# Altium footprint library Connector_Samtec_HLE_THT.PcbLib: 141 footprints (part 9 of 9)
Each footprint in its own frame and in the unit in brackets; x right, y up, seen from the top. Pads: shape width x height; smd on the part's side, far side on the other; paste and mask are expansions set on the pad; w line width, h text height; cw(c..) or ccw(c..) is an arc to the next point about the centre after c.
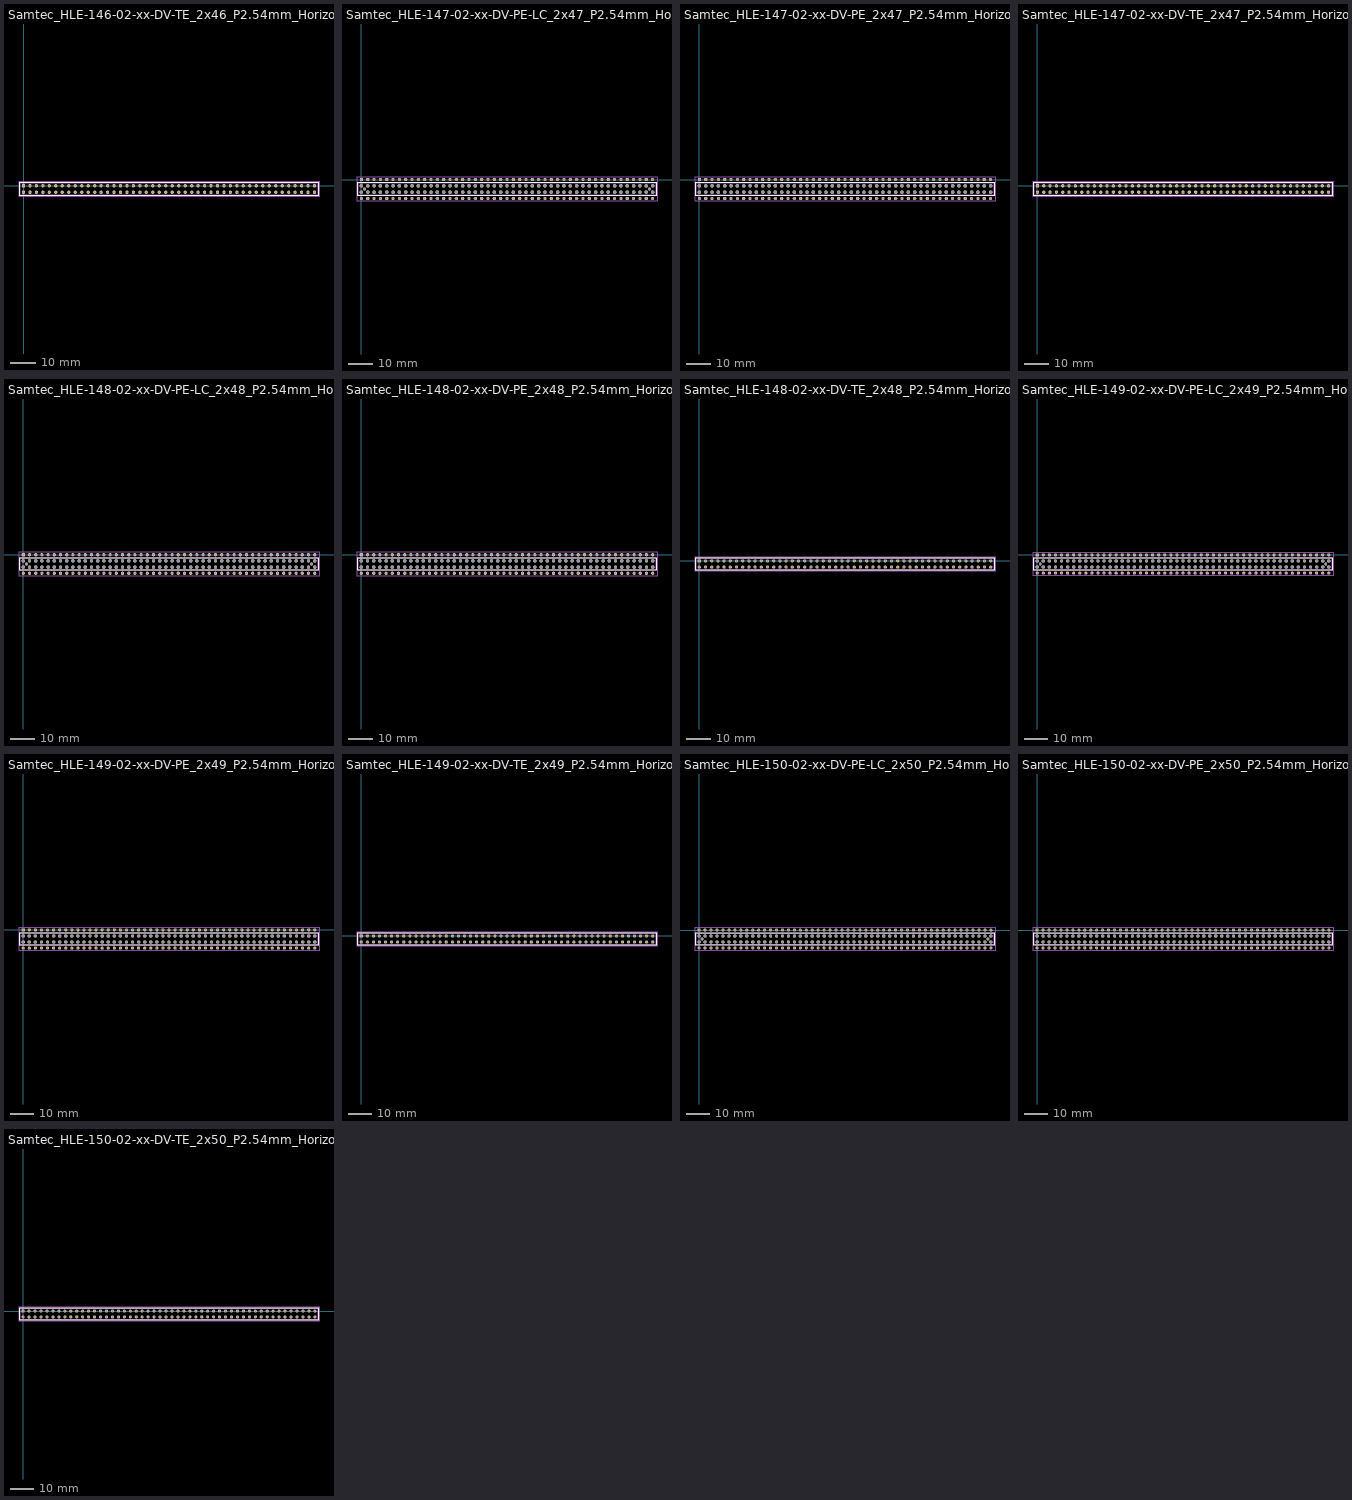
[diagram p8: the footprints below, top view; thin cyan lines are the x and y axes]

## Samtec_HLE-146-02-xx-DV-TE_2x46_P2.54mm_Horizontal [mm]
pads (92):
  rrect19% 1.31x1.31 hole 0.71: 1(0,0)
  round 1.31 hole 0.71: 2(0,-2.54) 3(2.54,0) 4(2.54,-2.54) 5(5.08,0) 6(5.08,-2.54) 7(7.62,0) 8(7.62,-2.54) 9(10.16,0) 10(10.16,-2.54) 11(12.7,0) 12(12.7,-2.54) 13(15.24,0) 14(15.24,-2.54) 15(17.78,0) 16(17.78,-2.54) 17(20.32,0) 18(20.32,-2.54) 19(22.86,0) 20(22.86,-2.54) 21(25.4,0) 22(25.4,-2.54) 23(27.94,0) 24(27.94,-2.54) 25(30.48,0) 26(30.48,-2.54) 27(33.02,0) 28(33.02,-2.54) 29(35.56,0) 30(35.56,-2.54) 31(38.1,0) 32(38.1,-2.54) 33(40.64,0) 34(40.64,-2.54) 35(43.18,0) 36(43.18,-2.54) 37(45.72,0) 38(45.72,-2.54) 39(48.26,0) 40(48.26,-2.54) 41(50.8,0) 42(50.8,-2.54) 43(53.34,0) 44(53.34,-2.54) 45(55.88,0) 46(55.88,-2.54) 47(58.42,0) 48(58.42,-2.54) 49(60.96,0) 50(60.96,-2.54) 51(63.5,0) 52(63.5,-2.54) 53(66.04,0) 54(66.04,-2.54) 55(68.58,0) 56(68.58,-2.54) 57(71.12,0) 58(71.12,-2.54) 59(73.66,0) 60(73.66,-2.54) 61(76.2,0) 62(76.2,-2.54) 63(78.74,0) 64(78.74,-2.54) 65(81.28,0) 66(81.28,-2.54) 67(83.82,0) 68(83.82,-2.54) 69(86.36,0) 70(86.36,-2.54) 71(88.9,0) 72(88.9,-2.54) 73(91.44,0) 74(91.44,-2.54) 75(93.98,0) 76(93.98,-2.54) 77(96.52,0) 78(96.52,-2.54) 79(99.06,0) 80(99.06,-2.54) 81(101.6,0) 82(101.6,-2.54) 83(104.14,0) 84(104.14,-2.54) 85(106.68,0) 86(106.68,-2.54) 87(109.22,0) 88(109.22,-2.54) 89(111.76,0) 90(111.76,-2.54) 91(114.3,0) 92(114.3,-2.54)
F.SilkS:
  lines w0.12: -1.38,-3.92 115.68,-3.92 115.68,1.38 -1.38,1.38 -1.38,-3.92
F.CrtYd:
  lines w0.05: -1.77,-4.31 116.07,-4.31 116.07,1.77 -1.77,1.77 -1.77,-4.31
F.Fab:
  lines w0.1: -0.5,1.27 0,0.563 0.5,1.27 ; -1.27,-3.81 -1.27,1.27 115.57,1.27 115.57,-3.81 -1.27,-3.81
  text "'.Designator'" at 53.103,-3.95 h1

## Samtec_HLE-147-02-xx-DV-PE-LC_2x47_P2.54mm_Horizontal [mm]
pads (190):
  rrect19% 1.31x1.31 hole 0.71: 1(0,0)
  round 1.31 hole 0.71: 2(0,-7.62) 3(2.54,0) 4(2.54,-7.62) 5(5.08,0) 6(5.08,-7.62) 7(7.62,0) 8(7.62,-7.62) 9(10.16,0) 10(10.16,-7.62) 11(12.7,0) 12(12.7,-7.62) 13(15.24,0) 14(15.24,-7.62) 15(17.78,0) 16(17.78,-7.62) 17(20.32,0) 18(20.32,-7.62) 19(22.86,0) 20(22.86,-7.62) 21(25.4,0) 22(25.4,-7.62) 23(27.94,0) 24(27.94,-7.62) 25(30.48,0) 26(30.48,-7.62) 27(33.02,0) 28(33.02,-7.62) 29(35.56,0) 30(35.56,-7.62) 31(38.1,0) 32(38.1,-7.62) 33(40.64,0) 34(40.64,-7.62) 35(43.18,0) 36(43.18,-7.62) 37(45.72,0) 38(45.72,-7.62) 39(48.26,0) 40(48.26,-7.62) 41(50.8,0) 42(50.8,-7.62) 43(53.34,0) 44(53.34,-7.62) 45(55.88,0) 46(55.88,-7.62) 47(58.42,0) 48(58.42,-7.62) 49(60.96,0) 50(60.96,-7.62) 51(63.5,0) 52(63.5,-7.62) 53(66.04,0) 54(66.04,-7.62) 55(68.58,0) 56(68.58,-7.62) 57(71.12,0) 58(71.12,-7.62) 59(73.66,0) 60(73.66,-7.62) 61(76.2,0) 62(76.2,-7.62) 63(78.74,0) 64(78.74,-7.62) 65(81.28,0) 66(81.28,-7.62) 67(83.82,0) 68(83.82,-7.62) 69(86.36,0) 70(86.36,-7.62) 71(88.9,0) 72(88.9,-7.62) 73(91.44,0) 74(91.44,-7.62) 75(93.98,0) 76(93.98,-7.62) 77(96.52,0) 78(96.52,-7.62) 79(99.06,0) 80(99.06,-7.62) 81(101.6,0) 82(101.6,-7.62) 83(104.14,0) 84(104.14,-7.62) 85(106.68,0) 86(106.68,-7.62) 87(109.22,0) 88(109.22,-7.62) 89(111.76,0) 90(111.76,-7.62) 91(114.3,0) 92(114.3,-7.62) 93(116.84,0) 94(116.84,-7.62)
  round 1.4 hole 1.4: Un1(12.7,-2.54) Un2(83.82,-2.54) Un3(71.12,-5.08) Un4(111.76,-2.54) Un5(27.94,-2.54) Un6(20.32,-5.08) Un7(96.52,-2.54) Un8(33.02,-2.54) Un9(10.16,-5.08) Un10(25.4,-2.54) Un11(60.96,-5.08) Un12(55.88,-5.08) Un13(66.04,-2.54) Un14(10.16,-2.54) Un15(73.66,-5.08) Un16(20.32,-2.54) Un17(86.36,-5.08) Un18(68.58,-2.54) Un19(50.8,-5.08) Un20(63.5,-5.08) Un21(76.2,-5.08) Un22(116.84,-5.08) Un23(109.22,-5.08) Un24(17.78,-5.08) Un25(114.3,-2.54) Un26(109.22,-2.54) Un27(58.42,-2.54) Un28(5.08,-5.08) Un29(73.66,-2.54) Un30(99.06,-2.54) Un31(15.24,-2.54) Un32(33.02,-5.08) Un33(93.98,-5.08) Un34(104.14,-2.54) Un35(12.7,-5.08) Un36(93.98,-2.54) Un37(35.56,-5.08) Un38(114.3,-5.08) Un39(17.78,-2.54) Un40(101.6,-5.08) Un41(0,-2.54) Un42(22.86,-5.08) Un43(91.44,-5.08) Un44(30.48,-2.54) Un45(60.96,-2.54) Un46(106.68,-5.08) Un47(38.1,-5.08) Un48(91.44,-2.54) Un49(38.1,-2.54) Un50(81.28,-2.54) Un51(104.14,-5.08) Un52(71.12,-2.54) Un53(53.34,-5.08) Un54(78.74,-2.54) Un55(55.88,-2.54) Un56(27.94,-5.08) Un57(83.82,-5.08) Un58(101.6,-2.54) Un59(53.34,-2.54) Un60(40.64,-5.08) Un61(111.76,-5.08) Un63(116.84,-2.54) Un64(43.18,-2.54) Un65(78.74,-5.08) Un66(99.06,-5.08) Un67(7.62,-5.08) Un68(30.48,-5.08) Un69(25.4,-5.08) Un70(5.08,-2.54) Un71(48.26,-5.08) Un72(63.5,-2.54) Un73(58.42,-5.08) Un74(35.56,-2.54) Un75(0,-5.08) Un76(2.54,-5.08) Un77(88.9,-5.08) Un78(22.86,-2.54) Un79(88.9,-2.54) Un80(50.8,-2.54) Un81(86.36,-2.54) Un82(48.26,-2.54) Un83(66.04,-5.08) Un84(68.58,-5.08) Un85(45.72,-5.08) Un86(76.2,-2.54) Un87(15.24,-5.08) Un88(96.52,-5.08) Un89(7.62,-2.54) Un90(106.68,-2.54) Un92(43.18,-5.08) Un93(45.72,-2.54) Un94(2.54,-2.54) Un95(81.28,-5.08) Un96(40.64,-2.54)
  round 1.19 hole 1.19: Un62(115.57,-3.81) Un91(1.27,-3.81)
F.SilkS:
  lines w0.12: -1.38,-6.46 118.22,-6.46 118.22,-1.16 -1.38,-1.16 -1.38,-6.46
F.CrtYd:
  lines w0.05: -1.77,-8.78 118.61,-8.78 118.61,1.16 -1.77,1.16 -1.77,-8.78
F.Fab:
  lines w0.1: -0.5,-1.27 0,-1.977 0.5,-1.27 ; -1.27,-6.35 -1.27,-1.27 118.11,-1.27 118.11,-6.35 -1.27,-6.35
  text "'.Designator'" at 54.373,-6.49 h1

## Samtec_HLE-147-02-xx-DV-PE_2x47_P2.54mm_Horizontal [mm]
pads (188):
  rrect19% 1.31x1.31 hole 0.71: 1(0,0)
  round 1.31 hole 0.71: 2(0,-7.62) 3(2.54,0) 4(2.54,-7.62) 5(5.08,0) 6(5.08,-7.62) 7(7.62,0) 8(7.62,-7.62) 9(10.16,0) 10(10.16,-7.62) 11(12.7,0) 12(12.7,-7.62) 13(15.24,0) 14(15.24,-7.62) 15(17.78,0) 16(17.78,-7.62) 17(20.32,0) 18(20.32,-7.62) 19(22.86,0) 20(22.86,-7.62) 21(25.4,0) 22(25.4,-7.62) 23(27.94,0) 24(27.94,-7.62) 25(30.48,0) 26(30.48,-7.62) 27(33.02,0) 28(33.02,-7.62) 29(35.56,0) 30(35.56,-7.62) 31(38.1,0) 32(38.1,-7.62) 33(40.64,0) 34(40.64,-7.62) 35(43.18,0) 36(43.18,-7.62) 37(45.72,0) 38(45.72,-7.62) 39(48.26,0) 40(48.26,-7.62) 41(50.8,0) 42(50.8,-7.62) 43(53.34,0) 44(53.34,-7.62) 45(55.88,0) 46(55.88,-7.62) 47(58.42,0) 48(58.42,-7.62) 49(60.96,0) 50(60.96,-7.62) 51(63.5,0) 52(63.5,-7.62) 53(66.04,0) 54(66.04,-7.62) 55(68.58,0) 56(68.58,-7.62) 57(71.12,0) 58(71.12,-7.62) 59(73.66,0) 60(73.66,-7.62) 61(76.2,0) 62(76.2,-7.62) 63(78.74,0) 64(78.74,-7.62) 65(81.28,0) 66(81.28,-7.62) 67(83.82,0) 68(83.82,-7.62) 69(86.36,0) 70(86.36,-7.62) 71(88.9,0) 72(88.9,-7.62) 73(91.44,0) 74(91.44,-7.62) 75(93.98,0) 76(93.98,-7.62) 77(96.52,0) 78(96.52,-7.62) 79(99.06,0) 80(99.06,-7.62) 81(101.6,0) 82(101.6,-7.62) 83(104.14,0) 84(104.14,-7.62) 85(106.68,0) 86(106.68,-7.62) 87(109.22,0) 88(109.22,-7.62) 89(111.76,0) 90(111.76,-7.62) 91(114.3,0) 92(114.3,-7.62) 93(116.84,0) 94(116.84,-7.62)
  round 1.4 hole 1.4: Un1(91.44,-5.08) Un2(45.72,-2.54) Un3(43.18,-5.08) Un4(20.32,-5.08) Un5(43.18,-2.54) Un6(40.64,-2.54) Un7(96.52,-5.08) Un8(88.9,-2.54) Un9(66.04,-5.08) Un10(30.48,-2.54) Un11(48.26,-2.54) Un12(114.3,-5.08) Un13(81.28,-2.54) Un14(93.98,-2.54) Un15(15.24,-2.54) Un16(116.84,-5.08) Un17(30.48,-5.08) Un18(35.56,-2.54) Un19(73.66,-5.08) Un20(53.34,-5.08) Un21(106.68,-5.08) Un22(25.4,-2.54) Un23(5.08,-5.08) Un24(2.54,-2.54) Un25(106.68,-2.54) Un26(60.96,-5.08) Un27(27.94,-5.08) Un28(111.76,-5.08) Un29(0,-2.54) Un30(35.56,-5.08) Un31(0,-5.08) Un32(116.84,-2.54) Un33(99.06,-2.54) Un34(15.24,-5.08) Un35(101.6,-5.08) Un36(33.02,-2.54) Un37(109.22,-5.08) Un38(5.08,-2.54) Un39(109.22,-2.54) Un40(71.12,-5.08) Un41(86.36,-5.08) Un42(17.78,-2.54) Un43(101.6,-2.54) Un44(38.1,-5.08) Un45(10.16,-2.54) Un46(86.36,-2.54) Un47(111.76,-2.54) Un48(104.14,-2.54) Un49(50.8,-2.54) Un50(38.1,-2.54) Un51(83.82,-2.54) Un52(25.4,-5.08) Un53(78.74,-5.08) Un54(114.3,-2.54) Un55(55.88,-5.08) Un56(2.54,-5.08) Un57(76.2,-5.08) Un58(104.14,-5.08) Un59(83.82,-5.08) Un60(91.44,-2.54) Un61(68.58,-2.54) Un62(60.96,-2.54) Un63(12.7,-5.08) Un64(12.7,-2.54) Un65(58.42,-5.08) Un66(55.88,-2.54) Un67(50.8,-5.08) Un68(17.78,-5.08) Un69(76.2,-2.54) Un70(93.98,-5.08) Un71(22.86,-5.08) Un72(45.72,-5.08) Un73(22.86,-2.54) Un74(53.34,-2.54) Un75(63.5,-5.08) Un76(7.62,-5.08) Un77(78.74,-2.54) Un78(88.9,-5.08) Un79(58.42,-2.54) Un80(27.94,-2.54) Un81(10.16,-5.08) Un82(7.62,-2.54) Un83(63.5,-2.54) Un84(48.26,-5.08) Un85(81.28,-5.08) Un86(73.66,-2.54) Un87(68.58,-5.08) Un88(40.64,-5.08) Un89(20.32,-2.54) Un90(33.02,-5.08) Un91(96.52,-2.54) Un92(99.06,-5.08) Un93(66.04,-2.54) Un94(71.12,-2.54)
F.SilkS:
  lines w0.12: -1.38,-6.46 -1.38,-1.16 118.22,-1.16 118.22,-6.46 -1.38,-6.46
F.CrtYd:
  lines w0.05: -1.77,-8.78 -1.77,1.16 118.61,1.16 118.61,-8.78 -1.77,-8.78
F.Fab:
  lines w0.1: -0.5,-1.27 0,-1.977 0.5,-1.27 ; -1.27,-6.35 118.11,-6.35 118.11,-1.27 -1.27,-1.27 -1.27,-6.35
  text "'.Designator'" at 54.373,-6.49 h1

## Samtec_HLE-147-02-xx-DV-TE_2x47_P2.54mm_Horizontal [mm]
pads (94):
  rrect19% 1.31x1.31 hole 0.71: 1(0,0)
  round 1.31 hole 0.71: 2(0,-2.54) 3(2.54,0) 4(2.54,-2.54) 5(5.08,0) 6(5.08,-2.54) 7(7.62,0) 8(7.62,-2.54) 9(10.16,0) 10(10.16,-2.54) 11(12.7,0) 12(12.7,-2.54) 13(15.24,0) 14(15.24,-2.54) 15(17.78,0) 16(17.78,-2.54) 17(20.32,0) 18(20.32,-2.54) 19(22.86,0) 20(22.86,-2.54) 21(25.4,0) 22(25.4,-2.54) 23(27.94,0) 24(27.94,-2.54) 25(30.48,0) 26(30.48,-2.54) 27(33.02,0) 28(33.02,-2.54) 29(35.56,0) 30(35.56,-2.54) 31(38.1,0) 32(38.1,-2.54) 33(40.64,0) 34(40.64,-2.54) 35(43.18,0) 36(43.18,-2.54) 37(45.72,0) 38(45.72,-2.54) 39(48.26,0) 40(48.26,-2.54) 41(50.8,0) 42(50.8,-2.54) 43(53.34,0) 44(53.34,-2.54) 45(55.88,0) 46(55.88,-2.54) 47(58.42,0) 48(58.42,-2.54) 49(60.96,0) 50(60.96,-2.54) 51(63.5,0) 52(63.5,-2.54) 53(66.04,0) 54(66.04,-2.54) 55(68.58,0) 56(68.58,-2.54) 57(71.12,0) 58(71.12,-2.54) 59(73.66,0) 60(73.66,-2.54) 61(76.2,0) 62(76.2,-2.54) 63(78.74,0) 64(78.74,-2.54) 65(81.28,0) 66(81.28,-2.54) 67(83.82,0) 68(83.82,-2.54) 69(86.36,0) 70(86.36,-2.54) 71(88.9,0) 72(88.9,-2.54) 73(91.44,0) 74(91.44,-2.54) 75(93.98,0) 76(93.98,-2.54) 77(96.52,0) 78(96.52,-2.54) 79(99.06,0) 80(99.06,-2.54) 81(101.6,0) 82(101.6,-2.54) 83(104.14,0) 84(104.14,-2.54) 85(106.68,0) 86(106.68,-2.54) 87(109.22,0) 88(109.22,-2.54) 89(111.76,0) 90(111.76,-2.54) 91(114.3,0) 92(114.3,-2.54) 93(116.84,0) 94(116.84,-2.54)
F.SilkS:
  lines w0.12: -1.38,-3.92 118.22,-3.92 118.22,1.38 -1.38,1.38 -1.38,-3.92
F.CrtYd:
  lines w0.05: -1.77,-4.31 118.61,-4.31 118.61,1.77 -1.77,1.77 -1.77,-4.31
F.Fab:
  lines w0.1: -0.5,1.27 0,0.563 0.5,1.27 ; -1.27,-3.81 118.11,-3.81 118.11,1.27 -1.27,1.27 -1.27,-3.81
  text "'.Designator'" at 54.373,-3.95 h1

## Samtec_HLE-148-02-xx-DV-PE-LC_2x48_P2.54mm_Horizontal [mm]
pads (194):
  rrect19% 1.31x1.31 hole 0.71: 1(0,0)
  round 1.31 hole 0.71: 2(0,-7.62) 3(2.54,0) 4(2.54,-7.62) 5(5.08,0) 6(5.08,-7.62) 7(7.62,0) 8(7.62,-7.62) 9(10.16,0) 10(10.16,-7.62) 11(12.7,0) 12(12.7,-7.62) 13(15.24,0) 14(15.24,-7.62) 15(17.78,0) 16(17.78,-7.62) 17(20.32,0) 18(20.32,-7.62) 19(22.86,0) 20(22.86,-7.62) 21(25.4,0) 22(25.4,-7.62) 23(27.94,0) 24(27.94,-7.62) 25(30.48,0) 26(30.48,-7.62) 27(33.02,0) 28(33.02,-7.62) 29(35.56,0) 30(35.56,-7.62) 31(38.1,0) 32(38.1,-7.62) 33(40.64,0) 34(40.64,-7.62) 35(43.18,0) 36(43.18,-7.62) 37(45.72,0) 38(45.72,-7.62) 39(48.26,0) 40(48.26,-7.62) 41(50.8,0) 42(50.8,-7.62) 43(53.34,0) 44(53.34,-7.62) 45(55.88,0) 46(55.88,-7.62) 47(58.42,0) 48(58.42,-7.62) 49(60.96,0) 50(60.96,-7.62) 51(63.5,0) 52(63.5,-7.62) 53(66.04,0) 54(66.04,-7.62) 55(68.58,0) 56(68.58,-7.62) 57(71.12,0) 58(71.12,-7.62) 59(73.66,0) 60(73.66,-7.62) 61(76.2,0) 62(76.2,-7.62) 63(78.74,0) 64(78.74,-7.62) 65(81.28,0) 66(81.28,-7.62) 67(83.82,0) 68(83.82,-7.62) 69(86.36,0) 70(86.36,-7.62) 71(88.9,0) 72(88.9,-7.62) 73(91.44,0) 74(91.44,-7.62) 75(93.98,0) 76(93.98,-7.62) 77(96.52,0) 78(96.52,-7.62) 79(99.06,0) 80(99.06,-7.62) 81(101.6,0) 82(101.6,-7.62) 83(104.14,0) 84(104.14,-7.62) 85(106.68,0) 86(106.68,-7.62) 87(109.22,0) 88(109.22,-7.62) 89(111.76,0) 90(111.76,-7.62) 91(114.3,0) 92(114.3,-7.62) 93(116.84,0) 94(116.84,-7.62) 95(119.38,0) 96(119.38,-7.62)
  round 1.4 hole 1.4: Un1(81.28,-2.54) Un2(10.16,-2.54) Un3(5.08,-2.54) Un4(60.96,-2.54) Un5(40.64,-2.54) Un6(83.82,-5.08) Un7(68.58,-5.08) Un8(63.5,-5.08) Un9(111.76,-5.08) Un10(66.04,-2.54) Un11(30.48,-5.08) Un12(119.38,-5.08) Un13(91.44,-5.08) Un14(5.08,-5.08) Un15(101.6,-5.08) Un16(27.94,-5.08) Un17(12.7,-5.08) Un18(48.26,-2.54) Un19(106.68,-5.08) Un20(114.3,-2.54) Un21(25.4,-2.54) Un22(50.8,-2.54) Un23(104.14,-2.54) Un25(88.9,-5.08) Un26(63.5,-2.54) Un27(93.98,-5.08) Un28(43.18,-5.08) Un29(116.84,-2.54) Un30(43.18,-2.54) Un31(20.32,-5.08) Un32(86.36,-5.08) Un33(106.68,-2.54) Un34(60.96,-5.08) Un35(76.2,-2.54) Un36(17.78,-2.54) Un37(93.98,-2.54) Un38(99.06,-2.54) Un39(109.22,-5.08) Un40(22.86,-2.54) Un41(96.52,-5.08) Un42(10.16,-5.08) Un43(30.48,-2.54) Un44(48.26,-5.08) Un45(0,-2.54) Un46(76.2,-5.08) Un47(71.12,-2.54) Un48(15.24,-5.08) Un49(45.72,-2.54) Un50(7.62,-5.08) Un51(55.88,-5.08) Un52(109.22,-2.54) Un53(25.4,-5.08) Un54(91.44,-2.54) Un55(2.54,-5.08) Un56(73.66,-2.54) Un57(86.36,-2.54) Un58(12.7,-2.54) Un59(119.38,-2.54) Un60(35.56,-5.08) Un61(53.34,-2.54) Un62(58.42,-5.08) Un63(27.94,-2.54) Un64(58.42,-2.54) Un65(104.14,-5.08) Un67(38.1,-2.54) Un68(15.24,-2.54) Un69(35.56,-2.54) Un70(111.76,-2.54) Un71(78.74,-2.54) Un72(33.02,-5.08) Un73(114.3,-5.08) Un74(17.78,-5.08) Un75(99.06,-5.08) Un76(71.12,-5.08) Un77(83.82,-2.54) Un78(88.9,-2.54) Un79(2.54,-2.54) Un80(33.02,-2.54) Un81(22.86,-5.08) Un82(68.58,-2.54) Un83(0,-5.08) Un84(116.84,-5.08) Un85(96.52,-2.54) Un86(81.28,-5.08) Un87(40.64,-5.08) Un88(38.1,-5.08) Un89(78.74,-5.08) Un90(55.88,-2.54) Un91(53.34,-5.08) Un92(66.04,-5.08) Un93(7.62,-2.54) Un94(45.72,-5.08) Un95(101.6,-2.54) Un96(20.32,-2.54) Un97(73.66,-5.08) Un98(50.8,-5.08)
  round 1.19 hole 1.19: Un24(118.11,-3.81) Un66(1.27,-3.81)
F.SilkS:
  lines w0.12: -1.38,-6.46 120.76,-6.46 120.76,-1.16 -1.38,-1.16 -1.38,-6.46
F.CrtYd:
  lines w0.05: -1.77,-8.78 -1.77,1.16 121.15,1.16 121.15,-8.78 -1.77,-8.78
F.Fab:
  lines w0.1: -0.5,-1.27 0,-1.977 0.5,-1.27 ; -1.27,-6.35 120.65,-6.35 120.65,-1.27 -1.27,-1.27 -1.27,-6.35
  text "'.Designator'" at 55.643,-6.49 h1

## Samtec_HLE-148-02-xx-DV-PE_2x48_P2.54mm_Horizontal [mm]
pads (192):
  rrect19% 1.31x1.31 hole 0.71: 1(0,0)
  round 1.31 hole 0.71: 2(0,-7.62) 3(2.54,0) 4(2.54,-7.62) 5(5.08,0) 6(5.08,-7.62) 7(7.62,0) 8(7.62,-7.62) 9(10.16,0) 10(10.16,-7.62) 11(12.7,0) 12(12.7,-7.62) 13(15.24,0) 14(15.24,-7.62) 15(17.78,0) 16(17.78,-7.62) 17(20.32,0) 18(20.32,-7.62) 19(22.86,0) 20(22.86,-7.62) 21(25.4,0) 22(25.4,-7.62) 23(27.94,0) 24(27.94,-7.62) 25(30.48,0) 26(30.48,-7.62) 27(33.02,0) 28(33.02,-7.62) 29(35.56,0) 30(35.56,-7.62) 31(38.1,0) 32(38.1,-7.62) 33(40.64,0) 34(40.64,-7.62) 35(43.18,0) 36(43.18,-7.62) 37(45.72,0) 38(45.72,-7.62) 39(48.26,0) 40(48.26,-7.62) 41(50.8,0) 42(50.8,-7.62) 43(53.34,0) 44(53.34,-7.62) 45(55.88,0) 46(55.88,-7.62) 47(58.42,0) 48(58.42,-7.62) 49(60.96,0) 50(60.96,-7.62) 51(63.5,0) 52(63.5,-7.62) 53(66.04,0) 54(66.04,-7.62) 55(68.58,0) 56(68.58,-7.62) 57(71.12,0) 58(71.12,-7.62) 59(73.66,0) 60(73.66,-7.62) 61(76.2,0) 62(76.2,-7.62) 63(78.74,0) 64(78.74,-7.62) 65(81.28,0) 66(81.28,-7.62) 67(83.82,0) 68(83.82,-7.62) 69(86.36,0) 70(86.36,-7.62) 71(88.9,0) 72(88.9,-7.62) 73(91.44,0) 74(91.44,-7.62) 75(93.98,0) 76(93.98,-7.62) 77(96.52,0) 78(96.52,-7.62) 79(99.06,0) 80(99.06,-7.62) 81(101.6,0) 82(101.6,-7.62) 83(104.14,0) 84(104.14,-7.62) 85(106.68,0) 86(106.68,-7.62) 87(109.22,0) 88(109.22,-7.62) 89(111.76,0) 90(111.76,-7.62) 91(114.3,0) 92(114.3,-7.62) 93(116.84,0) 94(116.84,-7.62) 95(119.38,0) 96(119.38,-7.62)
  round 1.4 hole 1.4: Un1(104.14,-5.08) Un2(66.04,-5.08) Un3(2.54,-5.08) Un4(86.36,-5.08) Un5(58.42,-5.08) Un6(73.66,-2.54) Un7(116.84,-2.54) Un8(76.2,-5.08) Un9(5.08,-5.08) Un10(78.74,-2.54) Un11(109.22,-5.08) Un12(109.22,-2.54) Un13(83.82,-5.08) Un14(30.48,-5.08) Un15(30.48,-2.54) Un16(10.16,-5.08) Un17(35.56,-5.08) Un18(53.34,-5.08) Un19(93.98,-2.54) Un20(20.32,-2.54) Un21(43.18,-5.08) Un22(53.34,-2.54) Un23(2.54,-2.54) Un24(104.14,-2.54) Un25(15.24,-5.08) Un26(81.28,-5.08) Un27(25.4,-2.54) Un28(111.76,-2.54) Un29(10.16,-2.54) Un30(86.36,-2.54) Un31(38.1,-2.54) Un32(12.7,-2.54) Un33(0,-5.08) Un34(71.12,-5.08) Un35(119.38,-2.54) Un36(50.8,-2.54) Un37(40.64,-5.08) Un38(12.7,-5.08) Un39(27.94,-2.54) Un40(22.86,-2.54) Un41(81.28,-2.54) Un42(25.4,-5.08) Un43(35.56,-2.54) Un44(33.02,-5.08) Un45(106.68,-2.54) Un46(48.26,-5.08) Un47(111.76,-5.08) Un48(0,-2.54) Un49(101.6,-5.08) Un50(68.58,-5.08) Un51(7.62,-2.54) Un52(99.06,-5.08) Un53(27.94,-5.08) Un54(63.5,-2.54) Un55(15.24,-2.54) Un56(91.44,-5.08) Un57(96.52,-2.54) Un58(88.9,-2.54) Un59(106.68,-5.08) Un60(17.78,-2.54) Un61(20.32,-5.08) Un62(55.88,-2.54) Un63(99.06,-2.54) Un64(116.84,-5.08) Un65(93.98,-5.08) Un66(55.88,-5.08) Un67(22.86,-5.08) Un68(50.8,-5.08) Un69(119.38,-5.08) Un70(83.82,-2.54) Un71(40.64,-2.54) Un72(88.9,-5.08) Un73(73.66,-5.08) Un74(68.58,-2.54) Un75(60.96,-2.54) Un76(63.5,-5.08) Un77(43.18,-2.54) Un78(66.04,-2.54) Un79(96.52,-5.08) Un80(114.3,-5.08) Un81(48.26,-2.54) Un82(38.1,-5.08) Un83(7.62,-5.08) Un84(17.78,-5.08) Un85(71.12,-2.54) Un86(60.96,-5.08) Un87(101.6,-2.54) Un88(58.42,-2.54) Un89(91.44,-2.54) Un90(33.02,-2.54) Un91(45.72,-2.54) Un92(5.08,-2.54) Un93(78.74,-5.08) Un94(114.3,-2.54) Un95(76.2,-2.54) Un96(45.72,-5.08)
F.SilkS:
  lines w0.12: -1.38,-6.46 -1.38,-1.16 120.76,-1.16 120.76,-6.46 -1.38,-6.46
F.CrtYd:
  lines w0.05: -1.77,-8.78 -1.77,1.16 121.15,1.16 121.15,-8.78 -1.77,-8.78
F.Fab:
  lines w0.1: -0.5,-1.27 0,-1.977 0.5,-1.27 ; -1.27,-6.35 120.65,-6.35 120.65,-1.27 -1.27,-1.27 -1.27,-6.35
  text "'.Designator'" at 55.643,-6.49 h1

## Samtec_HLE-148-02-xx-DV-TE_2x48_P2.54mm_Horizontal [mm]
pads (96):
  rrect19% 1.31x1.31 hole 0.71: 1(0,0)
  round 1.31 hole 0.71: 2(0,-2.54) 3(2.54,0) 4(2.54,-2.54) 5(5.08,0) 6(5.08,-2.54) 7(7.62,0) 8(7.62,-2.54) 9(10.16,0) 10(10.16,-2.54) 11(12.7,0) 12(12.7,-2.54) 13(15.24,0) 14(15.24,-2.54) 15(17.78,0) 16(17.78,-2.54) 17(20.32,0) 18(20.32,-2.54) 19(22.86,0) 20(22.86,-2.54) 21(25.4,0) 22(25.4,-2.54) 23(27.94,0) 24(27.94,-2.54) 25(30.48,0) 26(30.48,-2.54) 27(33.02,0) 28(33.02,-2.54) 29(35.56,0) 30(35.56,-2.54) 31(38.1,0) 32(38.1,-2.54) 33(40.64,0) 34(40.64,-2.54) 35(43.18,0) 36(43.18,-2.54) 37(45.72,0) 38(45.72,-2.54) 39(48.26,0) 40(48.26,-2.54) 41(50.8,0) 42(50.8,-2.54) 43(53.34,0) 44(53.34,-2.54) 45(55.88,0) 46(55.88,-2.54) 47(58.42,0) 48(58.42,-2.54) 49(60.96,0) 50(60.96,-2.54) 51(63.5,0) 52(63.5,-2.54) 53(66.04,0) 54(66.04,-2.54) 55(68.58,0) 56(68.58,-2.54) 57(71.12,0) 58(71.12,-2.54) 59(73.66,0) 60(73.66,-2.54) 61(76.2,0) 62(76.2,-2.54) 63(78.74,0) 64(78.74,-2.54) 65(81.28,0) 66(81.28,-2.54) 67(83.82,0) 68(83.82,-2.54) 69(86.36,0) 70(86.36,-2.54) 71(88.9,0) 72(88.9,-2.54) 73(91.44,0) 74(91.44,-2.54) 75(93.98,0) 76(93.98,-2.54) 77(96.52,0) 78(96.52,-2.54) 79(99.06,0) 80(99.06,-2.54) 81(101.6,0) 82(101.6,-2.54) 83(104.14,0) 84(104.14,-2.54) 85(106.68,0) 86(106.68,-2.54) 87(109.22,0) 88(109.22,-2.54) 89(111.76,0) 90(111.76,-2.54) 91(114.3,0) 92(114.3,-2.54) 93(116.84,0) 94(116.84,-2.54) 95(119.38,0) 96(119.38,-2.54)
F.SilkS:
  lines w0.12: -1.38,-3.92 120.76,-3.92 120.76,1.38 -1.38,1.38 -1.38,-3.92
F.CrtYd:
  lines w0.05: -1.77,-4.31 -1.77,1.77 121.15,1.77 121.15,-4.31 -1.77,-4.31
F.Fab:
  lines w0.1: -0.5,1.27 0,0.563 0.5,1.27 ; -1.27,-3.81 -1.27,1.27 120.65,1.27 120.65,-3.81 -1.27,-3.81
  text "'.Designator'" at 55.643,-3.95 h1

## Samtec_HLE-149-02-xx-DV-PE-LC_2x49_P2.54mm_Horizontal [mm]
pads (198):
  rrect19% 1.31x1.31 hole 0.71: 1(0,0)
  round 1.31 hole 0.71: 2(0,-7.62) 3(2.54,0) 4(2.54,-7.62) 5(5.08,0) 6(5.08,-7.62) 7(7.62,0) 8(7.62,-7.62) 9(10.16,0) 10(10.16,-7.62) 11(12.7,0) 12(12.7,-7.62) 13(15.24,0) 14(15.24,-7.62) 15(17.78,0) 16(17.78,-7.62) 17(20.32,0) 18(20.32,-7.62) 19(22.86,0) 20(22.86,-7.62) 21(25.4,0) 22(25.4,-7.62) 23(27.94,0) 24(27.94,-7.62) 25(30.48,0) 26(30.48,-7.62) 27(33.02,0) 28(33.02,-7.62) 29(35.56,0) 30(35.56,-7.62) 31(38.1,0) 32(38.1,-7.62) 33(40.64,0) 34(40.64,-7.62) 35(43.18,0) 36(43.18,-7.62) 37(45.72,0) 38(45.72,-7.62) 39(48.26,0) 40(48.26,-7.62) 41(50.8,0) 42(50.8,-7.62) 43(53.34,0) 44(53.34,-7.62) 45(55.88,0) 46(55.88,-7.62) 47(58.42,0) 48(58.42,-7.62) 49(60.96,0) 50(60.96,-7.62) 51(63.5,0) 52(63.5,-7.62) 53(66.04,0) 54(66.04,-7.62) 55(68.58,0) 56(68.58,-7.62) 57(71.12,0) 58(71.12,-7.62) 59(73.66,0) 60(73.66,-7.62) 61(76.2,0) 62(76.2,-7.62) 63(78.74,0) 64(78.74,-7.62) 65(81.28,0) 66(81.28,-7.62) 67(83.82,0) 68(83.82,-7.62) 69(86.36,0) 70(86.36,-7.62) 71(88.9,0) 72(88.9,-7.62) 73(91.44,0) 74(91.44,-7.62) 75(93.98,0) 76(93.98,-7.62) 77(96.52,0) 78(96.52,-7.62) 79(99.06,0) 80(99.06,-7.62) 81(101.6,0) 82(101.6,-7.62) 83(104.14,0) 84(104.14,-7.62) 85(106.68,0) 86(106.68,-7.62) 87(109.22,0) 88(109.22,-7.62) 89(111.76,0) 90(111.76,-7.62) 91(114.3,0) 92(114.3,-7.62) 93(116.84,0) 94(116.84,-7.62) 95(119.38,0) 96(119.38,-7.62) 97(121.92,0) 98(121.92,-7.62)
  round 1.4 hole 1.4: Un1(43.18,-2.54) Un2(88.9,-2.54) Un3(93.98,-2.54) Un4(63.5,-2.54) Un5(121.92,-5.08) Un6(53.34,-2.54) Un7(58.42,-5.08) Un8(10.16,-2.54) Un9(60.96,-5.08) Un10(22.86,-5.08) Un11(2.54,-2.54) Un12(10.16,-5.08) Un13(20.32,-2.54) Un14(78.74,-5.08) Un15(20.32,-5.08) Un16(76.2,-5.08) Un17(0,-2.54) Un18(68.58,-2.54) Un19(109.22,-5.08) Un20(7.62,-2.54) Un21(96.52,-5.08) Un22(45.72,-5.08) Un23(40.64,-5.08) Un24(55.88,-2.54) Un25(58.42,-2.54) Un26(15.24,-5.08) Un27(50.8,-5.08) Un28(73.66,-2.54) Un29(17.78,-2.54) Un30(86.36,-5.08) Un31(30.48,-2.54) Un32(81.28,-2.54) Un33(114.3,-2.54) Un34(25.4,-5.08) Un35(68.58,-5.08) Un36(5.08,-2.54) Un37(83.82,-2.54) Un38(114.3,-5.08) Un39(2.54,-5.08) Un40(48.26,-2.54) Un41(106.68,-5.08) Un42(7.62,-5.08) Un43(111.76,-2.54) Un44(111.76,-5.08) Un45(0,-5.08) Un46(73.66,-5.08) Un47(12.7,-2.54) Un48(91.44,-2.54) Un49(78.74,-2.54) Un50(71.12,-5.08) Un51(17.78,-5.08) Un52(66.04,-5.08) Un53(48.26,-5.08) Un54(121.92,-2.54) Un55(88.9,-5.08) Un56(60.96,-2.54) Un57(43.18,-5.08) Un58(76.2,-2.54) Un59(33.02,-5.08) Un60(55.88,-5.08) Un61(106.68,-2.54) Un63(101.6,-2.54) Un64(27.94,-2.54) Un65(91.44,-5.08) Un66(81.28,-5.08) Un67(104.14,-2.54) Un68(50.8,-2.54) Un69(35.56,-2.54) Un70(25.4,-2.54) Un71(104.14,-5.08) Un72(5.08,-5.08) Un73(99.06,-5.08) Un74(93.98,-5.08) Un75(101.6,-5.08) Un76(12.7,-5.08) Un77(63.5,-5.08) Un78(83.82,-5.08) Un79(30.48,-5.08) Un80(38.1,-5.08) Un81(45.72,-2.54) Un83(86.36,-2.54) Un84(27.94,-5.08) Un85(99.06,-2.54) Un86(40.64,-2.54) Un87(109.22,-2.54) Un88(119.38,-2.54) Un89(119.38,-5.08) Un90(66.04,-2.54) Un91(15.24,-2.54) Un92(71.12,-2.54) Un93(35.56,-5.08) Un94(22.86,-2.54) Un95(38.1,-2.54) Un96(116.84,-5.08) Un97(53.34,-5.08) Un98(96.52,-2.54) Un99(116.84,-2.54) Un100(33.02,-2.54)
  round 1.19 hole 1.19: Un62(120.65,-3.81) Un82(1.27,-3.81)
F.SilkS:
  lines w0.12: -1.38,-6.46 123.3,-6.46 123.3,-1.16 -1.38,-1.16 -1.38,-6.46
F.CrtYd:
  lines w0.05: -1.77,-8.78 -1.77,1.16 123.69,1.16 123.69,-8.78 -1.77,-8.78
F.Fab:
  lines w0.1: -0.5,-1.27 0,-1.977 0.5,-1.27 ; -1.27,-6.35 -1.27,-1.27 123.19,-1.27 123.19,-6.35 -1.27,-6.35
  text "'.Designator'" at 56.913,-6.49 h1

## Samtec_HLE-149-02-xx-DV-PE_2x49_P2.54mm_Horizontal [mm]
pads (196):
  rrect19% 1.31x1.31 hole 0.71: 1(0,0)
  round 1.31 hole 0.71: 2(0,-7.62) 3(2.54,0) 4(2.54,-7.62) 5(5.08,0) 6(5.08,-7.62) 7(7.62,0) 8(7.62,-7.62) 9(10.16,0) 10(10.16,-7.62) 11(12.7,0) 12(12.7,-7.62) 13(15.24,0) 14(15.24,-7.62) 15(17.78,0) 16(17.78,-7.62) 17(20.32,0) 18(20.32,-7.62) 19(22.86,0) 20(22.86,-7.62) 21(25.4,0) 22(25.4,-7.62) 23(27.94,0) 24(27.94,-7.62) 25(30.48,0) 26(30.48,-7.62) 27(33.02,0) 28(33.02,-7.62) 29(35.56,0) 30(35.56,-7.62) 31(38.1,0) 32(38.1,-7.62) 33(40.64,0) 34(40.64,-7.62) 35(43.18,0) 36(43.18,-7.62) 37(45.72,0) 38(45.72,-7.62) 39(48.26,0) 40(48.26,-7.62) 41(50.8,0) 42(50.8,-7.62) 43(53.34,0) 44(53.34,-7.62) 45(55.88,0) 46(55.88,-7.62) 47(58.42,0) 48(58.42,-7.62) 49(60.96,0) 50(60.96,-7.62) 51(63.5,0) 52(63.5,-7.62) 53(66.04,0) 54(66.04,-7.62) 55(68.58,0) 56(68.58,-7.62) 57(71.12,0) 58(71.12,-7.62) 59(73.66,0) 60(73.66,-7.62) 61(76.2,0) 62(76.2,-7.62) 63(78.74,0) 64(78.74,-7.62) 65(81.28,0) 66(81.28,-7.62) 67(83.82,0) 68(83.82,-7.62) 69(86.36,0) 70(86.36,-7.62) 71(88.9,0) 72(88.9,-7.62) 73(91.44,0) 74(91.44,-7.62) 75(93.98,0) 76(93.98,-7.62) 77(96.52,0) 78(96.52,-7.62) 79(99.06,0) 80(99.06,-7.62) 81(101.6,0) 82(101.6,-7.62) 83(104.14,0) 84(104.14,-7.62) 85(106.68,0) 86(106.68,-7.62) 87(109.22,0) 88(109.22,-7.62) 89(111.76,0) 90(111.76,-7.62) 91(114.3,0) 92(114.3,-7.62) 93(116.84,0) 94(116.84,-7.62) 95(119.38,0) 96(119.38,-7.62) 97(121.92,0) 98(121.92,-7.62)
  round 1.4 hole 1.4: Un1(27.94,-5.08) Un2(68.58,-2.54) Un3(25.4,-2.54) Un4(76.2,-2.54) Un5(55.88,-5.08) Un6(0,-2.54) Un7(104.14,-2.54) Un8(22.86,-2.54) Un9(2.54,-5.08) Un10(27.94,-2.54) Un11(109.22,-2.54) Un12(25.4,-5.08) Un13(20.32,-2.54) Un14(50.8,-5.08) Un15(35.56,-5.08) Un16(81.28,-2.54) Un17(43.18,-5.08) Un18(35.56,-2.54) Un19(7.62,-5.08) Un20(73.66,-5.08) Un21(116.84,-2.54) Un22(76.2,-5.08) Un23(43.18,-2.54) Un24(104.14,-5.08) Un25(83.82,-2.54) Un26(71.12,-2.54) Un27(99.06,-2.54) Un28(53.34,-5.08) Un29(5.08,-5.08) Un30(12.7,-5.08) Un31(96.52,-2.54) Un32(68.58,-5.08) Un33(86.36,-5.08) Un34(55.88,-2.54) Un35(101.6,-5.08) Un36(63.5,-5.08) Un37(58.42,-2.54) Un38(121.92,-2.54) Un39(93.98,-5.08) Un40(99.06,-5.08) Un41(83.82,-5.08) Un42(93.98,-2.54) Un43(40.64,-5.08) Un44(91.44,-5.08) Un45(63.5,-2.54) Un46(22.86,-5.08) Un47(17.78,-5.08) Un48(78.74,-2.54) Un49(66.04,-5.08) Un50(111.76,-2.54) Un51(45.72,-5.08) Un52(30.48,-5.08) Un53(88.9,-5.08) Un54(106.68,-5.08) Un55(109.22,-5.08) Un56(7.62,-2.54) Un57(50.8,-2.54) Un58(119.38,-2.54) Un59(58.42,-5.08) Un60(116.84,-5.08) Un61(15.24,-2.54) Un62(60.96,-2.54) Un63(38.1,-5.08) Un64(101.6,-2.54) Un65(106.68,-2.54) Un66(81.28,-5.08) Un67(48.26,-5.08) Un68(96.52,-5.08) Un69(0,-5.08) Un70(2.54,-2.54) Un71(114.3,-2.54) Un72(60.96,-5.08) Un73(20.32,-5.08) Un74(17.78,-2.54) Un75(33.02,-2.54) Un76(88.9,-2.54) Un77(15.24,-5.08) Un78(10.16,-5.08) Un79(12.7,-2.54) Un80(66.04,-2.54) Un81(30.48,-2.54) Un82(48.26,-2.54) Un83(114.3,-5.08) Un84(73.66,-2.54) Un85(119.38,-5.08) Un86(38.1,-2.54) Un87(111.76,-5.08) Un88(10.16,-2.54) Un89(78.74,-5.08) Un90(71.12,-5.08) Un91(53.34,-2.54) Un92(33.02,-5.08) Un93(5.08,-2.54) Un94(40.64,-2.54) Un95(86.36,-2.54) Un96(45.72,-2.54) Un97(121.92,-5.08) Un98(91.44,-2.54)
F.SilkS:
  lines w0.12: -1.38,-6.46 123.3,-6.46 123.3,-1.16 -1.38,-1.16 -1.38,-6.46
F.CrtYd:
  lines w0.05: -1.77,-8.78 -1.77,1.16 123.69,1.16 123.69,-8.78 -1.77,-8.78
F.Fab:
  lines w0.1: -0.5,-1.27 0,-1.977 0.5,-1.27 ; -1.27,-6.35 -1.27,-1.27 123.19,-1.27 123.19,-6.35 -1.27,-6.35
  text "'.Designator'" at 56.913,-6.49 h1

## Samtec_HLE-149-02-xx-DV-TE_2x49_P2.54mm_Horizontal [mm]
pads (98):
  rrect19% 1.31x1.31 hole 0.71: 1(0,0)
  round 1.31 hole 0.71: 2(0,-2.54) 3(2.54,0) 4(2.54,-2.54) 5(5.08,0) 6(5.08,-2.54) 7(7.62,0) 8(7.62,-2.54) 9(10.16,0) 10(10.16,-2.54) 11(12.7,0) 12(12.7,-2.54) 13(15.24,0) 14(15.24,-2.54) 15(17.78,0) 16(17.78,-2.54) 17(20.32,0) 18(20.32,-2.54) 19(22.86,0) 20(22.86,-2.54) 21(25.4,0) 22(25.4,-2.54) 23(27.94,0) 24(27.94,-2.54) 25(30.48,0) 26(30.48,-2.54) 27(33.02,0) 28(33.02,-2.54) 29(35.56,0) 30(35.56,-2.54) 31(38.1,0) 32(38.1,-2.54) 33(40.64,0) 34(40.64,-2.54) 35(43.18,0) 36(43.18,-2.54) 37(45.72,0) 38(45.72,-2.54) 39(48.26,0) 40(48.26,-2.54) 41(50.8,0) 42(50.8,-2.54) 43(53.34,0) 44(53.34,-2.54) 45(55.88,0) 46(55.88,-2.54) 47(58.42,0) 48(58.42,-2.54) 49(60.96,0) 50(60.96,-2.54) 51(63.5,0) 52(63.5,-2.54) 53(66.04,0) 54(66.04,-2.54) 55(68.58,0) 56(68.58,-2.54) 57(71.12,0) 58(71.12,-2.54) 59(73.66,0) 60(73.66,-2.54) 61(76.2,0) 62(76.2,-2.54) 63(78.74,0) 64(78.74,-2.54) 65(81.28,0) 66(81.28,-2.54) 67(83.82,0) 68(83.82,-2.54) 69(86.36,0) 70(86.36,-2.54) 71(88.9,0) 72(88.9,-2.54) 73(91.44,0) 74(91.44,-2.54) 75(93.98,0) 76(93.98,-2.54) 77(96.52,0) 78(96.52,-2.54) 79(99.06,0) 80(99.06,-2.54) 81(101.6,0) 82(101.6,-2.54) 83(104.14,0) 84(104.14,-2.54) 85(106.68,0) 86(106.68,-2.54) 87(109.22,0) 88(109.22,-2.54) 89(111.76,0) 90(111.76,-2.54) 91(114.3,0) 92(114.3,-2.54) 93(116.84,0) 94(116.84,-2.54) 95(119.38,0) 96(119.38,-2.54) 97(121.92,0) 98(121.92,-2.54)
F.SilkS:
  lines w0.12: -1.38,-3.92 -1.38,1.38 123.3,1.38 123.3,-3.92 -1.38,-3.92
F.CrtYd:
  lines w0.05: -1.77,-4.31 123.69,-4.31 123.69,1.77 -1.77,1.77 -1.77,-4.31
F.Fab:
  lines w0.1: -0.5,1.27 0,0.563 0.5,1.27 ; -1.27,-3.81 -1.27,1.27 123.19,1.27 123.19,-3.81 -1.27,-3.81
  text "'.Designator'" at 56.913,-3.95 h1

## Samtec_HLE-150-02-xx-DV-PE-LC_2x50_P2.54mm_Horizontal [mm]
pads (202):
  rrect19% 1.31x1.31 hole 0.71: 1(0,0)
  round 1.31 hole 0.71: 2(0,-7.62) 3(2.54,0) 4(2.54,-7.62) 5(5.08,0) 6(5.08,-7.62) 7(7.62,0) 8(7.62,-7.62) 9(10.16,0) 10(10.16,-7.62) 11(12.7,0) 12(12.7,-7.62) 13(15.24,0) 14(15.24,-7.62) 15(17.78,0) 16(17.78,-7.62) 17(20.32,0) 18(20.32,-7.62) 19(22.86,0) 20(22.86,-7.62) 21(25.4,0) 22(25.4,-7.62) 23(27.94,0) 24(27.94,-7.62) 25(30.48,0) 26(30.48,-7.62) 27(33.02,0) 28(33.02,-7.62) 29(35.56,0) 30(35.56,-7.62) 31(38.1,0) 32(38.1,-7.62) 33(40.64,0) 34(40.64,-7.62) 35(43.18,0) 36(43.18,-7.62) 37(45.72,0) 38(45.72,-7.62) 39(48.26,0) 40(48.26,-7.62) 41(50.8,0) 42(50.8,-7.62) 43(53.34,0) 44(53.34,-7.62) 45(55.88,0) 46(55.88,-7.62) 47(58.42,0) 48(58.42,-7.62) 49(60.96,0) 50(60.96,-7.62) 51(63.5,0) 52(63.5,-7.62) 53(66.04,0) 54(66.04,-7.62) 55(68.58,0) 56(68.58,-7.62) 57(71.12,0) 58(71.12,-7.62) 59(73.66,0) 60(73.66,-7.62) 61(76.2,0) 62(76.2,-7.62) 63(78.74,0) 64(78.74,-7.62) 65(81.28,0) 66(81.28,-7.62) 67(83.82,0) 68(83.82,-7.62) 69(86.36,0) 70(86.36,-7.62) 71(88.9,0) 72(88.9,-7.62) 73(91.44,0) 74(91.44,-7.62) 75(93.98,0) 76(93.98,-7.62) 77(96.52,0) 78(96.52,-7.62) 79(99.06,0) 80(99.06,-7.62) 81(101.6,0) 82(101.6,-7.62) 83(104.14,0) 84(104.14,-7.62) 85(106.68,0) 86(106.68,-7.62) 87(109.22,0) 88(109.22,-7.62) 89(111.76,0) 90(111.76,-7.62) 91(114.3,0) 92(114.3,-7.62) 93(116.84,0) 94(116.84,-7.62) 95(119.38,0) 96(119.38,-7.62) 97(121.92,0) 98(121.92,-7.62) 99(124.46,0) 100(124.46,-7.62)
  round 1.4 hole 1.4: Un1(58.42,-5.08) Un2(88.9,-2.54) Un3(55.88,-2.54) Un4(60.96,-2.54) Un5(71.12,-2.54) Un6(25.4,-5.08) Un8(119.38,-5.08) Un9(25.4,-2.54) Un10(101.6,-5.08) Un11(10.16,-2.54) Un12(96.52,-2.54) Un13(35.56,-2.54) Un14(66.04,-2.54) Un15(104.14,-2.54) Un16(43.18,-5.08) Un17(88.9,-5.08) Un18(76.2,-2.54) Un19(93.98,-5.08) Un20(114.3,-5.08) Un21(30.48,-2.54) Un22(20.32,-5.08) Un23(86.36,-5.08) Un24(116.84,-5.08) Un25(0,-2.54) Un26(15.24,-2.54) Un27(48.26,-2.54) Un28(33.02,-2.54) Un29(78.74,-5.08) Un30(106.68,-5.08) Un31(86.36,-2.54) Un32(5.08,-5.08) Un33(104.14,-5.08) Un34(124.46,-2.54) Un35(78.74,-2.54) Un36(73.66,-2.54) Un37(38.1,-2.54) Un38(5.08,-2.54) Un39(22.86,-2.54) Un40(7.62,-2.54) Un41(27.94,-5.08) Un42(53.34,-5.08) Un43(38.1,-5.08) Un45(121.92,-5.08) Un46(10.16,-5.08) Un47(71.12,-5.08) Un48(50.8,-2.54) Un49(53.34,-2.54) Un50(99.06,-5.08) Un51(17.78,-5.08) Un52(106.68,-2.54) Un53(124.46,-5.08) Un54(83.82,-5.08) Un55(2.54,-5.08) Un56(81.28,-5.08) Un57(12.7,-2.54) Un58(99.06,-2.54) Un59(40.64,-5.08) Un60(73.66,-5.08) Un61(114.3,-2.54) Un62(17.78,-2.54) Un63(63.5,-5.08) Un64(83.82,-2.54) Un65(45.72,-2.54) Un66(7.62,-5.08) Un67(58.42,-2.54) Un68(12.7,-5.08) Un69(91.44,-2.54) Un70(20.32,-2.54) Un71(81.28,-2.54) Un72(35.56,-5.08) Un73(119.38,-2.54) Un74(27.94,-2.54) Un75(0,-5.08) Un76(60.96,-5.08) Un77(40.64,-2.54) Un78(48.26,-5.08) Un79(68.58,-2.54) Un80(15.24,-5.08) Un81(109.22,-5.08) Un82(101.6,-2.54) Un83(93.98,-2.54) Un84(33.02,-5.08) Un85(91.44,-5.08) Un86(2.54,-2.54) Un87(30.48,-5.08) Un88(109.22,-2.54) Un89(66.04,-5.08) Un90(111.76,-2.54) Un91(76.2,-5.08) Un92(121.92,-2.54) Un93(96.52,-5.08) Un94(50.8,-5.08) Un95(68.58,-5.08) Un96(22.86,-5.08) Un97(111.76,-5.08) Un98(55.88,-5.08) Un99(43.18,-2.54) Un100(45.72,-5.08) Un101(63.5,-2.54) Un102(116.84,-2.54)
  round 1.19 hole 1.19: Un7(123.19,-3.81) Un44(1.27,-3.81)
F.SilkS:
  lines w0.12: -1.38,-6.46 -1.38,-1.16 125.84,-1.16 125.84,-6.46 -1.38,-6.46
F.CrtYd:
  lines w0.05: -1.77,-8.78 126.23,-8.78 126.23,1.16 -1.77,1.16 -1.77,-8.78
F.Fab:
  lines w0.1: -0.5,-1.27 0,-1.977 0.5,-1.27 ; -1.27,-6.35 125.73,-6.35 125.73,-1.27 -1.27,-1.27 -1.27,-6.35
  text "'.Designator'" at 58.183,-6.49 h1

## Samtec_HLE-150-02-xx-DV-PE_2x50_P2.54mm_Horizontal [mm]
pads (200):
  rrect19% 1.31x1.31 hole 0.71: 1(0,0)
  round 1.31 hole 0.71: 2(0,-7.62) 3(2.54,0) 4(2.54,-7.62) 5(5.08,0) 6(5.08,-7.62) 7(7.62,0) 8(7.62,-7.62) 9(10.16,0) 10(10.16,-7.62) 11(12.7,0) 12(12.7,-7.62) 13(15.24,0) 14(15.24,-7.62) 15(17.78,0) 16(17.78,-7.62) 17(20.32,0) 18(20.32,-7.62) 19(22.86,0) 20(22.86,-7.62) 21(25.4,0) 22(25.4,-7.62) 23(27.94,0) 24(27.94,-7.62) 25(30.48,0) 26(30.48,-7.62) 27(33.02,0) 28(33.02,-7.62) 29(35.56,0) 30(35.56,-7.62) 31(38.1,0) 32(38.1,-7.62) 33(40.64,0) 34(40.64,-7.62) 35(43.18,0) 36(43.18,-7.62) 37(45.72,0) 38(45.72,-7.62) 39(48.26,0) 40(48.26,-7.62) 41(50.8,0) 42(50.8,-7.62) 43(53.34,0) 44(53.34,-7.62) 45(55.88,0) 46(55.88,-7.62) 47(58.42,0) 48(58.42,-7.62) 49(60.96,0) 50(60.96,-7.62) 51(63.5,0) 52(63.5,-7.62) 53(66.04,0) 54(66.04,-7.62) 55(68.58,0) 56(68.58,-7.62) 57(71.12,0) 58(71.12,-7.62) 59(73.66,0) 60(73.66,-7.62) 61(76.2,0) 62(76.2,-7.62) 63(78.74,0) 64(78.74,-7.62) 65(81.28,0) 66(81.28,-7.62) 67(83.82,0) 68(83.82,-7.62) 69(86.36,0) 70(86.36,-7.62) 71(88.9,0) 72(88.9,-7.62) 73(91.44,0) 74(91.44,-7.62) 75(93.98,0) 76(93.98,-7.62) 77(96.52,0) 78(96.52,-7.62) 79(99.06,0) 80(99.06,-7.62) 81(101.6,0) 82(101.6,-7.62) 83(104.14,0) 84(104.14,-7.62) 85(106.68,0) 86(106.68,-7.62) 87(109.22,0) 88(109.22,-7.62) 89(111.76,0) 90(111.76,-7.62) 91(114.3,0) 92(114.3,-7.62) 93(116.84,0) 94(116.84,-7.62) 95(119.38,0) 96(119.38,-7.62) 97(121.92,0) 98(121.92,-7.62) 99(124.46,0) 100(124.46,-7.62)
  round 1.4 hole 1.4: Un1(104.14,-2.54) Un2(109.22,-5.08) Un3(22.86,-5.08) Un4(58.42,-5.08) Un5(78.74,-5.08) Un6(116.84,-2.54) Un7(99.06,-5.08) Un8(96.52,-5.08) Un9(114.3,-5.08) Un10(30.48,-2.54) Un11(12.7,-5.08) Un12(114.3,-2.54) Un13(48.26,-5.08) Un14(43.18,-5.08) Un15(111.76,-5.08) Un16(91.44,-5.08) Un17(15.24,-2.54) Un18(91.44,-2.54) Un19(40.64,-2.54) Un20(66.04,-5.08) Un21(88.9,-2.54) Un22(22.86,-2.54) Un23(35.56,-2.54) Un24(12.7,-2.54) Un25(7.62,-5.08) Un26(5.08,-2.54) Un27(93.98,-2.54) Un28(124.46,-5.08) Un29(60.96,-5.08) Un30(53.34,-2.54) Un31(63.5,-2.54) Un32(45.72,-2.54) Un33(17.78,-5.08) Un34(73.66,-5.08) Un35(20.32,-2.54) Un36(17.78,-2.54) Un37(33.02,-5.08) Un38(119.38,-5.08) Un39(30.48,-5.08) Un40(88.9,-5.08) Un41(5.08,-5.08) Un42(20.32,-5.08) Un43(106.68,-2.54) Un44(60.96,-2.54) Un45(68.58,-2.54) Un46(99.06,-2.54) Un47(50.8,-2.54) Un48(0,-2.54) Un49(101.6,-5.08) Un50(0,-5.08) Un51(81.28,-2.54) Un52(66.04,-2.54) Un53(121.92,-5.08) Un54(93.98,-5.08) Un55(124.46,-2.54) Un56(86.36,-2.54) Un57(83.82,-5.08) Un58(10.16,-2.54) Un59(50.8,-5.08) Un60(76.2,-5.08) Un61(10.16,-5.08) Un62(71.12,-5.08) Un63(106.68,-5.08) Un64(53.34,-5.08) Un65(116.84,-5.08) Un66(86.36,-5.08) Un67(25.4,-2.54) Un68(7.62,-2.54) Un69(38.1,-5.08) Un70(38.1,-2.54) Un71(27.94,-5.08) Un72(35.56,-5.08) Un73(63.5,-5.08) Un74(73.66,-2.54) Un75(119.38,-2.54) Un76(104.14,-5.08) Un77(15.24,-5.08) Un78(55.88,-2.54) Un79(2.54,-5.08) Un80(76.2,-2.54) Un81(68.58,-5.08) Un82(101.6,-2.54) Un83(96.52,-2.54) Un84(109.22,-2.54) Un85(45.72,-5.08) Un86(58.42,-2.54) Un87(78.74,-2.54) Un88(71.12,-2.54) Un89(33.02,-2.54) Un90(27.94,-2.54) Un91(2.54,-2.54) Un92(40.64,-5.08) Un93(83.82,-2.54) Un94(55.88,-5.08) Un95(43.18,-2.54) Un96(121.92,-2.54) Un97(111.76,-2.54) Un98(25.4,-5.08) Un99(48.26,-2.54) Un100(81.28,-5.08)
F.SilkS:
  lines w0.12: -1.38,-6.46 125.84,-6.46 125.84,-1.16 -1.38,-1.16 -1.38,-6.46
F.CrtYd:
  lines w0.05: -1.77,-8.78 -1.77,1.16 126.23,1.16 126.23,-8.78 -1.77,-8.78
F.Fab:
  lines w0.1: -0.5,-1.27 0,-1.977 0.5,-1.27 ; -1.27,-6.35 125.73,-6.35 125.73,-1.27 -1.27,-1.27 -1.27,-6.35
  text "'.Designator'" at 58.183,-6.49 h1

## Samtec_HLE-150-02-xx-DV-TE_2x50_P2.54mm_Horizontal [mm]
pads (100):
  rrect19% 1.31x1.31 hole 0.71: 1(0,0)
  round 1.31 hole 0.71: 2(0,-2.54) 3(2.54,0) 4(2.54,-2.54) 5(5.08,0) 6(5.08,-2.54) 7(7.62,0) 8(7.62,-2.54) 9(10.16,0) 10(10.16,-2.54) 11(12.7,0) 12(12.7,-2.54) 13(15.24,0) 14(15.24,-2.54) 15(17.78,0) 16(17.78,-2.54) 17(20.32,0) 18(20.32,-2.54) 19(22.86,0) 20(22.86,-2.54) 21(25.4,0) 22(25.4,-2.54) 23(27.94,0) 24(27.94,-2.54) 25(30.48,0) 26(30.48,-2.54) 27(33.02,0) 28(33.02,-2.54) 29(35.56,0) 30(35.56,-2.54) 31(38.1,0) 32(38.1,-2.54) 33(40.64,0) 34(40.64,-2.54) 35(43.18,0) 36(43.18,-2.54) 37(45.72,0) 38(45.72,-2.54) 39(48.26,0) 40(48.26,-2.54) 41(50.8,0) 42(50.8,-2.54) 43(53.34,0) 44(53.34,-2.54) 45(55.88,0) 46(55.88,-2.54) 47(58.42,0) 48(58.42,-2.54) 49(60.96,0) 50(60.96,-2.54) 51(63.5,0) 52(63.5,-2.54) 53(66.04,0) 54(66.04,-2.54) 55(68.58,0) 56(68.58,-2.54) 57(71.12,0) 58(71.12,-2.54) 59(73.66,0) 60(73.66,-2.54) 61(76.2,0) 62(76.2,-2.54) 63(78.74,0) 64(78.74,-2.54) 65(81.28,0) 66(81.28,-2.54) 67(83.82,0) 68(83.82,-2.54) 69(86.36,0) 70(86.36,-2.54) 71(88.9,0) 72(88.9,-2.54) 73(91.44,0) 74(91.44,-2.54) 75(93.98,0) 76(93.98,-2.54) 77(96.52,0) 78(96.52,-2.54) 79(99.06,0) 80(99.06,-2.54) 81(101.6,0) 82(101.6,-2.54) 83(104.14,0) 84(104.14,-2.54) 85(106.68,0) 86(106.68,-2.54) 87(109.22,0) 88(109.22,-2.54) 89(111.76,0) 90(111.76,-2.54) 91(114.3,0) 92(114.3,-2.54) 93(116.84,0) 94(116.84,-2.54) 95(119.38,0) 96(119.38,-2.54) 97(121.92,0) 98(121.92,-2.54) 99(124.46,0) 100(124.46,-2.54)
F.SilkS:
  lines w0.12: -1.38,-3.92 125.84,-3.92 125.84,1.38 -1.38,1.38 -1.38,-3.92
F.CrtYd:
  lines w0.05: -1.77,-4.31 -1.77,1.77 126.23,1.77 126.23,-4.31 -1.77,-4.31
F.Fab:
  lines w0.1: -0.5,1.27 0,0.563 0.5,1.27 ; -1.27,-3.81 125.73,-3.81 125.73,1.27 -1.27,1.27 -1.27,-3.81
  text "'.Designator'" at 58.183,-3.95 h1